# Altium footprint library 6-Connectors-3.PcbLib: 153 footprints (part 10 of 11)
Each footprint in its own frame and in the unit in brackets; x right, y up, seen from the top. Pads: shape width x height; smd on the part's side, far side on the other; paste and mask are expansions set on the pad; w line width, h text height; cw(c..) or ccw(c..) is an arc to the next point about the centre after c.
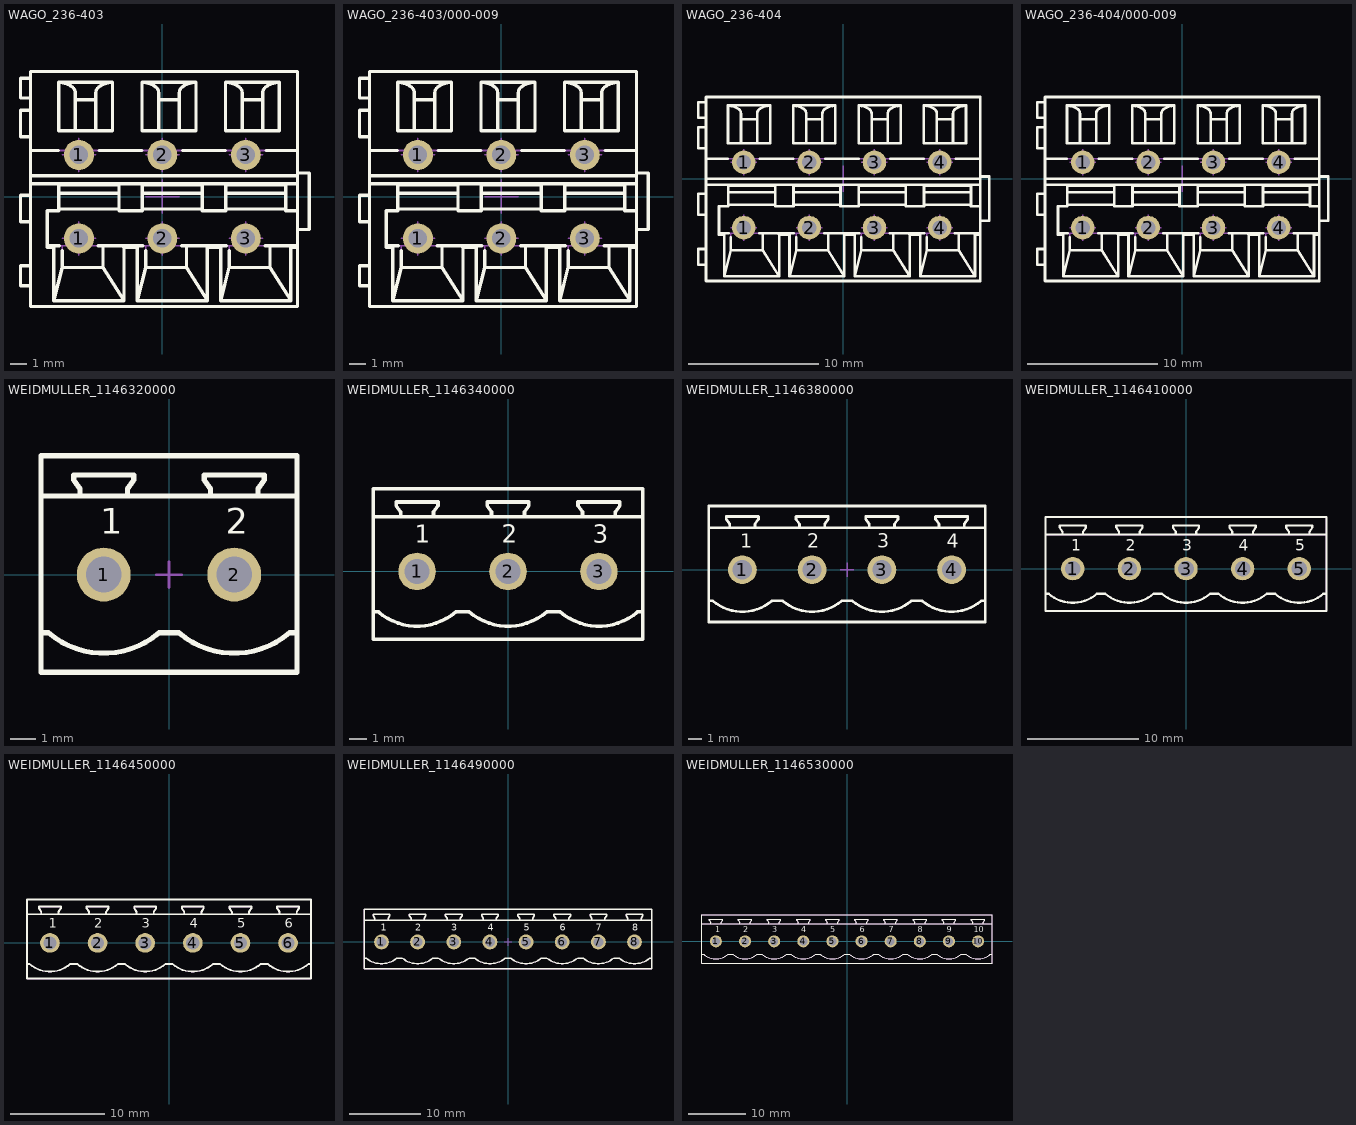
[diagram p9: the footprints below, top view; thin cyan lines are the x and y axes]

## WAGO_236-403 [mm] "16A 250VAC 3 Way PCB Terminal Block, Pitch 5mm, CAGE CLAMP?Connection, Wire Size Max: 2.5mm²"
height 13
pads (6):
  round 1.8 hole 1.1: 1(-5,-2.5) 1(-5,2.5) 2(0,-2.5) 2(0,2.5) 3(5,-2.5) 3(5,2.5)
Top Overlay:
  lines w0.2: -7.9,-5.34 -8.5,-5.34 -8.5,-4.14 -7.9,-4.14 ; -7.9,-1.51 -8.5,-1.51 -8.5,0.09 -7.9,0.09 ; -7.9,0.77 8.1,0.77 ; -7.9,1.256 8.1,1.256 -1.9,1.256 -1.4,1.256 ; -7.9,2.76 -6.223,2.76 ; -7.9,3.582 -8.5,3.582 -8.5,5.182 -7.9,5.182 ; -7.9,5.905 -8.5,5.905 -8.5,7.101 -7.9,7.101 ; -6.9,-2.937 -6.463,-2.937 ; -6.2,-0.745 -2.6,-0.745 ; -6.2,0.21 -2.6,0.21 ; -6.171,-2.937 -6.463,-2.937 ; -6,-3.25 -6,-4.245 ; -5.215,3.957 -5.215,6.149 ccw(c-5.715,6.192) -5.508,6.649 ccw(c-6.452,4.735) -6.215,6.857 ; -5.215,5.796 -3.985,5.796 ; -3.985,3.957 -3.985,6.149 cw(c-3.485,6.192) -3.692,6.649 cw(c-2.748,4.735) -2.985,6.857 ; -3.829,-2.937 -1.171,-2.937 ; -3.777,2.76 -1.223,2.76 ; -3.55,-2.937 -3.55,-4.245 ; -2.394,-2.937 -2.3,-3.043 ; -1.463,-2.937 -1.5,-3.043 ; -1.2,-0.745 2.4,-0.745 ; -1.2,0.21 2.4,0.21 ; -1,-3.25 -1,-4.245 ; -0.215,3.957 -0.215,6.149 ccw(c-0.715,6.192) -0.508,6.649 ccw(c-1.452,4.735) -1.215,6.857 ; -0.215,5.796 1.015,5.796 ; 1.015,3.957 1.015,6.149 cw(c1.515,6.192) 1.308,6.649 cw(c2.252,4.735) 2.015,6.857 ; 1.171,-2.937 3.829,-2.937 ; 1.223,2.76 3.777,2.76 ; 1.45,-2.937 1.45,-4.245 ; 2.606,-2.937 2.7,-3.043 ; 3.538,-2.937 3.5,-3.043 ; 3.8,-0.745 7.4,-0.745 ; 3.8,0.21 7.4,0.21 ; 4,-3.25 4,-4.245 ; 4.785,3.957 4.785,6.149 ccw(c4.285,6.192) 4.492,6.649 ccw(c3.548,4.735) 3.785,6.857 ; 4.785,5.796 6.015,5.796 ; 6.015,3.957 6.015,6.149 cw(c6.515,6.192) 6.308,6.649 cw(c7.252,4.735) 7.015,6.857 ; 6.171,-2.937 8.1,-2.937 ; 6.223,2.76 8.1,2.76 ; 6.45,-2.937 6.45,-4.245 ; 7.606,-2.937 7.7,-3.043 ; 8.1,-6.585 -7.9,-6.585 -7.9,7.5 8.1,7.5 8.1,-6.572 ; 8.1,-3.043 7.7,-3.043 ; 8.1,-1.968 8.8,-1.968 8.8,1.412 8.1,1.412 ; 8.1,-0.851 7.4,-0.851 7.4,0.705 3.8,0.705 3.8,-0.851 2.4,-0.851 2.4,0.705 -1.2,0.705 -1.2,-0.851 -2.6,-0.851 -2.6,0.705 -6.2,0.705 -6.2,-0.851 -6.9,-0.851 -6.9,-3.043 -6.5,-3.043 ; -6.5,-6.231 -6,-4.245 ; -6.5,-6.231 -2.3,-6.231 ; -6.5,-6.231 -6.5,-3.043 ; -6.5,-3.043 -6.463,-2.937 ; -6.215,6.857 -6.215,3.957 -2.985,3.957 -2.985,6.857 ; -6.215,6.857 -2.985,6.857 ; -6,-4.245 -3.55,-4.245 ; -3.55,-4.245 -2.3,-6.231 ; -2.3,-6.231 -2.3,-3.043 ; -2.3,-3.043 -1.5,-3.043 ; -1.5,-6.231 -1,-4.245 ; -1.5,-6.231 2.7,-6.231 ; -1.5,-6.231 -1.5,-3.043 ; -1.215,6.857 -1.215,3.957 2.015,3.957 2.015,6.857 ; -1.215,6.857 2.015,6.857 ; -1,-4.245 1.45,-4.245 ; 1.45,-4.245 2.7,-6.231 ; 2.7,-6.231 2.7,-3.043 ; 2.7,-3.043 3.5,-3.043 ; 3.5,-6.231 4,-4.245 ; 3.5,-6.231 7.7,-6.231 ; 3.5,-6.231 3.5,-3.043 ; 3.785,6.857 3.785,3.957 7.015,3.957 7.015,6.857 ; 3.785,6.857 7.015,6.857 ; 4,-4.245 6.45,-4.245 ; 6.45,-4.245 7.7,-6.231 ; 7.7,-6.231 7.7,-3.043
Mechanical 8:
  lines w0.1: -6,-2.5 -5,-2.5 ; -6,2.5 -5,2.5 ; -5,-3.5 -5,-2.5 ; -5,-1.5 -5,-2.5 ; -5,1.5 -5,2.5 ; -5,3.5 -5,2.5 ; -4,-2.5 -5,-2.5 ; -4,2.5 -5,2.5 ; -1,-2.5 0,-2.5 ; -1,0 0,0 ; -1,2.5 0,2.5 ; 0,-3.5 0,-2.5 ; 0,-1.5 0,-2.5 ; 0,-1 0,0 ; 0,1 0,0 ; 0,1.5 0,2.5 ; 0,3.5 0,2.5 ; 1,-2.5 0,-2.5 ; 1,0 0,0 ; 1,2.5 0,2.5 ; 4,-2.5 5,-2.5 ; 4,2.5 5,2.5 ; 5,-3.5 5,-2.5 ; 5,-1.5 5,-2.5 ; 5,1.5 5,2.5 ; 5,3.5 5,2.5 ; 6,-2.5 5,-2.5 ; 6,2.5 5,2.5
Mechanical 14:
  lines w0.1: -7.9,-5.34 -8.5,-5.34 -8.5,-4.14 -7.9,-4.14 ; -7.9,-1.51 -8.5,-1.51 -8.5,0.09 -7.9,0.09 ; -7.9,0.77 8.1,0.77 ; -7.9,1.256 8.1,1.256 -1.9,1.256 ; -7.9,2.76 8.1,2.76 ; -7.9,3.582 -8.5,3.582 -8.5,5.182 -7.9,5.182 ; -7.9,5.905 -8.5,5.905 -8.5,7.101 -7.9,7.101 ; -6.9,-2.937 8.1,-2.937 ; -6.463,-2.937 -6.5,-3.043 ; -6.2,-0.745 -2.6,-0.745 ; -6.2,0.21 -2.6,0.21 ; -6,-2.937 -6,-4.245 ; -5.215,3.957 -5.215,6.149 ccw(c-5.715,6.192) -5.508,6.649 ccw(c-6.452,4.735) -6.215,6.857 ; -5.215,5.796 -3.985,5.796 ; -3.985,3.957 -3.985,6.149 cw(c-3.485,6.192) -3.692,6.649 cw(c-2.748,4.735) -2.985,6.857 ; -3.55,-2.937 -3.55,-4.245 ; -2.394,-2.937 -2.3,-3.043 ; -1.463,-2.937 -1.5,-3.043 ; -1.2,-0.745 2.4,-0.745 ; -1.2,0.21 2.4,0.21 ; -1,-2.937 -1,-4.245 ; -0.215,3.957 -0.215,6.149 ccw(c-0.715,6.192) -0.508,6.649 ccw(c-1.452,4.735) -1.215,6.857 ; -0.215,5.796 1.015,5.796 ; 1.015,3.957 1.015,6.149 cw(c1.515,6.192) 1.308,6.649 cw(c2.252,4.735) 2.015,6.857 ; 1.45,-2.937 1.45,-4.245 ; 2.606,-2.937 2.7,-3.043 ; 3.538,-2.937 3.5,-3.043 ; 3.8,-0.745 7.4,-0.745 ; 3.8,0.21 7.4,0.21 ; 4,-2.937 4,-4.245 ; 4.785,3.957 4.785,6.149 ccw(c4.285,6.192) 4.492,6.649 ccw(c3.548,4.735) 3.785,6.857 ; 4.785,5.796 6.015,5.796 ; 6.015,3.957 6.015,6.149 cw(c6.515,6.192) 6.308,6.649 cw(c7.252,4.735) 7.015,6.857 ; 6.45,-2.937 6.45,-4.245 ; 7.606,-2.937 7.7,-3.043 ; 8.1,-6.585 -7.9,-6.585 -7.9,7.5 8.1,7.5 8.1,-6.572 ; 8.1,-3.043 7.7,-3.043 ; 8.1,-1.968 8.8,-1.968 8.8,1.412 8.1,1.412 ; 8.1,-0.851 7.4,-0.851 7.4,0.705 3.8,0.705 3.8,-0.851 2.4,-0.851 2.4,0.705 -1.2,0.705 -1.2,-0.851 -2.6,-0.851 -2.6,0.705 -6.2,0.705 -6.2,-0.851 -6.9,-0.851 -6.9,-3.043 -6.5,-3.043 ; -6.5,-6.231 -6,-4.245 ; -6.5,-6.231 -2.3,-6.231 ; -6.5,-6.231 -6.5,-3.043 ; -6.215,6.857 -6.215,3.957 -2.985,3.957 -2.985,6.857 ; -6.215,6.857 -2.985,6.857 ; -6,-4.245 -3.55,-4.245 ; -3.55,-4.245 -2.3,-6.231 ; -2.3,-6.231 -2.3,-3.043 ; -2.3,-3.043 -1.5,-3.043 ; -1.5,-6.231 -1,-4.245 ; -1.5,-6.231 2.7,-6.231 ; -1.5,-6.231 -1.5,-3.043 ; -1.215,6.857 -1.215,3.957 2.015,3.957 2.015,6.857 ; -1.215,6.857 2.015,6.857 ; -1,-4.245 1.45,-4.245 ; 1.45,-4.245 2.7,-6.231 ; 2.7,-6.231 2.7,-3.043 ; 2.7,-3.043 3.5,-3.043 ; 3.5,-6.231 4,-4.245 ; 3.5,-6.231 7.7,-6.231 ; 3.5,-6.231 3.5,-3.043 ; 3.785,6.857 3.785,3.957 7.015,3.957 7.015,6.857 ; 3.785,6.857 7.015,6.857 ; 4,-4.245 6.45,-4.245 ; 6.45,-4.245 7.7,-6.231 ; 7.7,-6.231 7.7,-3.043
3D body "WAGO_236-403.stp": height 12.71, standoff -4, extent -8.5,-6.585 8.8,7.5

## WAGO_236-403/000-009 [mm] "16A 250VAC 3 Way PCB Terminal Block, Pitch 5mm, CAGE CLAMP?Connection, Wire Size Max: 2.5mm²"
height 13
pads (6):
  round 1.8 hole 1.1: 1(-5,-2.5) 1(-5,2.5) 2(0,-2.5) 2(0,2.5) 3(5,-2.5) 3(5,2.5)
Top Overlay:
  lines w0.2: -7.9,-5.34 -8.5,-5.34 -8.5,-4.14 -7.9,-4.14 ; -7.9,-1.51 -8.5,-1.51 -8.5,0.09 -7.9,0.09 ; -7.9,0.77 8.1,0.77 ; -7.9,1.256 8.1,1.256 -1.9,1.256 -1.4,1.256 ; -7.9,2.76 -6.223,2.76 ; -7.9,3.582 -8.5,3.582 -8.5,5.182 -7.9,5.182 ; -7.9,5.905 -8.5,5.905 -8.5,7.101 -7.9,7.101 ; -6.9,-2.937 -6.463,-2.937 ; -6.2,-0.745 -2.6,-0.745 ; -6.2,0.21 -2.6,0.21 ; -6.171,-2.937 -6.463,-2.937 ; -6,-3.25 -6,-4.245 ; -5.215,3.957 -5.215,6.149 ccw(c-5.715,6.192) -5.508,6.649 ccw(c-6.452,4.735) -6.215,6.857 ; -5.215,5.796 -3.985,5.796 ; -3.985,3.957 -3.985,6.149 cw(c-3.485,6.192) -3.692,6.649 cw(c-2.748,4.735) -2.985,6.857 ; -3.829,-2.937 -1.171,-2.937 ; -3.777,2.76 -1.223,2.76 ; -3.55,-2.937 -3.55,-4.245 ; -2.394,-2.937 -2.3,-3.043 ; -1.463,-2.937 -1.5,-3.043 ; -1.2,-0.745 2.4,-0.745 ; -1.2,0.21 2.4,0.21 ; -1,-3.25 -1,-4.245 ; -0.215,3.957 -0.215,6.149 ccw(c-0.715,6.192) -0.508,6.649 ccw(c-1.452,4.735) -1.215,6.857 ; -0.215,5.796 1.015,5.796 ; 1.015,3.957 1.015,6.149 cw(c1.515,6.192) 1.308,6.649 cw(c2.252,4.735) 2.015,6.857 ; 1.171,-2.937 3.829,-2.937 ; 1.223,2.76 3.777,2.76 ; 1.45,-2.937 1.45,-4.245 ; 2.606,-2.937 2.7,-3.043 ; 3.538,-2.937 3.5,-3.043 ; 3.8,-0.745 7.4,-0.745 ; 3.8,0.21 7.4,0.21 ; 4,-3.25 4,-4.245 ; 4.785,3.957 4.785,6.149 ccw(c4.285,6.192) 4.492,6.649 ccw(c3.548,4.735) 3.785,6.857 ; 4.785,5.796 6.015,5.796 ; 6.015,3.957 6.015,6.149 cw(c6.515,6.192) 6.308,6.649 cw(c7.252,4.735) 7.015,6.857 ; 6.171,-2.937 8.1,-2.937 ; 6.223,2.76 8.1,2.76 ; 6.45,-2.937 6.45,-4.245 ; 7.606,-2.937 7.7,-3.043 ; 8.1,-6.585 -7.9,-6.585 -7.9,7.5 8.1,7.5 8.1,-6.572 ; 8.1,-3.043 7.7,-3.043 ; 8.1,-1.968 8.8,-1.968 8.8,1.412 8.1,1.412 ; 8.1,-0.851 7.4,-0.851 7.4,0.705 3.8,0.705 3.8,-0.851 2.4,-0.851 2.4,0.705 -1.2,0.705 -1.2,-0.851 -2.6,-0.851 -2.6,0.705 -6.2,0.705 -6.2,-0.851 -6.9,-0.851 -6.9,-3.043 -6.5,-3.043 ; -6.5,-6.231 -6,-4.245 ; -6.5,-6.231 -2.3,-6.231 ; -6.5,-6.231 -6.5,-3.043 ; -6.5,-3.043 -6.463,-2.937 ; -6.215,6.857 -6.215,3.957 -2.985,3.957 -2.985,6.857 ; -6.215,6.857 -2.985,6.857 ; -6,-4.245 -3.55,-4.245 ; -3.55,-4.245 -2.3,-6.231 ; -2.3,-6.231 -2.3,-3.043 ; -2.3,-3.043 -1.5,-3.043 ; -1.5,-6.231 -1,-4.245 ; -1.5,-6.231 2.7,-6.231 ; -1.5,-6.231 -1.5,-3.043 ; -1.215,6.857 -1.215,3.957 2.015,3.957 2.015,6.857 ; -1.215,6.857 2.015,6.857 ; -1,-4.245 1.45,-4.245 ; 1.45,-4.245 2.7,-6.231 ; 2.7,-6.231 2.7,-3.043 ; 2.7,-3.043 3.5,-3.043 ; 3.5,-6.231 4,-4.245 ; 3.5,-6.231 7.7,-6.231 ; 3.5,-6.231 3.5,-3.043 ; 3.785,6.857 3.785,3.957 7.015,3.957 7.015,6.857 ; 3.785,6.857 7.015,6.857 ; 4,-4.245 6.45,-4.245 ; 6.45,-4.245 7.7,-6.231 ; 7.7,-6.231 7.7,-3.043
Mechanical 8:
  lines w0.1: -6,-2.5 -5,-2.5 ; -6,2.5 -5,2.5 ; -5,-3.5 -5,-2.5 ; -5,-1.5 -5,-2.5 ; -5,1.5 -5,2.5 ; -5,3.5 -5,2.5 ; -4,-2.5 -5,-2.5 ; -4,2.5 -5,2.5 ; -1,-2.5 0,-2.5 ; -1,0 0,0 ; -1,2.5 0,2.5 ; 0,-3.5 0,-2.5 ; 0,-1.5 0,-2.5 ; 0,-1 0,0 ; 0,1 0,0 ; 0,1.5 0,2.5 ; 0,3.5 0,2.5 ; 1,-2.5 0,-2.5 ; 1,0 0,0 ; 1,2.5 0,2.5 ; 4,-2.5 5,-2.5 ; 4,2.5 5,2.5 ; 5,-3.5 5,-2.5 ; 5,-1.5 5,-2.5 ; 5,1.5 5,2.5 ; 5,3.5 5,2.5 ; 6,-2.5 5,-2.5 ; 6,2.5 5,2.5
Mechanical 14:
  lines w0.1: -7.9,-5.34 -8.5,-5.34 -8.5,-4.14 -7.9,-4.14 ; -7.9,-1.51 -8.5,-1.51 -8.5,0.09 -7.9,0.09 ; -7.9,0.77 8.1,0.77 ; -7.9,1.256 8.1,1.256 -1.9,1.256 ; -7.9,2.76 8.1,2.76 ; -7.9,3.582 -8.5,3.582 -8.5,5.182 -7.9,5.182 ; -7.9,5.905 -8.5,5.905 -8.5,7.101 -7.9,7.101 ; -6.9,-2.937 8.1,-2.937 ; -6.463,-2.937 -6.5,-3.043 ; -6.2,-0.745 -2.6,-0.745 ; -6.2,0.21 -2.6,0.21 ; -6,-2.937 -6,-4.245 ; -5.215,3.957 -5.215,6.149 ccw(c-5.715,6.192) -5.508,6.649 ccw(c-6.452,4.735) -6.215,6.857 ; -5.215,5.796 -3.985,5.796 ; -3.985,3.957 -3.985,6.149 cw(c-3.485,6.192) -3.692,6.649 cw(c-2.748,4.735) -2.985,6.857 ; -3.55,-2.937 -3.55,-4.245 ; -2.394,-2.937 -2.3,-3.043 ; -1.463,-2.937 -1.5,-3.043 ; -1.2,-0.745 2.4,-0.745 ; -1.2,0.21 2.4,0.21 ; -1,-2.937 -1,-4.245 ; -0.215,3.957 -0.215,6.149 ccw(c-0.715,6.192) -0.508,6.649 ccw(c-1.452,4.735) -1.215,6.857 ; -0.215,5.796 1.015,5.796 ; 1.015,3.957 1.015,6.149 cw(c1.515,6.192) 1.308,6.649 cw(c2.252,4.735) 2.015,6.857 ; 1.45,-2.937 1.45,-4.245 ; 2.606,-2.937 2.7,-3.043 ; 3.538,-2.937 3.5,-3.043 ; 3.8,-0.745 7.4,-0.745 ; 3.8,0.21 7.4,0.21 ; 4,-2.937 4,-4.245 ; 4.785,3.957 4.785,6.149 ccw(c4.285,6.192) 4.492,6.649 ccw(c3.548,4.735) 3.785,6.857 ; 4.785,5.796 6.015,5.796 ; 6.015,3.957 6.015,6.149 cw(c6.515,6.192) 6.308,6.649 cw(c7.252,4.735) 7.015,6.857 ; 6.45,-2.937 6.45,-4.245 ; 7.606,-2.937 7.7,-3.043 ; 8.1,-6.585 -7.9,-6.585 -7.9,7.5 8.1,7.5 8.1,-6.572 ; 8.1,-3.043 7.7,-3.043 ; 8.1,-1.968 8.8,-1.968 8.8,1.412 8.1,1.412 ; 8.1,-0.851 7.4,-0.851 7.4,0.705 3.8,0.705 3.8,-0.851 2.4,-0.851 2.4,0.705 -1.2,0.705 -1.2,-0.851 -2.6,-0.851 -2.6,0.705 -6.2,0.705 -6.2,-0.851 -6.9,-0.851 -6.9,-3.043 -6.5,-3.043 ; -6.5,-6.231 -6,-4.245 ; -6.5,-6.231 -2.3,-6.231 ; -6.5,-6.231 -6.5,-3.043 ; -6.215,6.857 -6.215,3.957 -2.985,3.957 -2.985,6.857 ; -6.215,6.857 -2.985,6.857 ; -6,-4.245 -3.55,-4.245 ; -3.55,-4.245 -2.3,-6.231 ; -2.3,-6.231 -2.3,-3.043 ; -2.3,-3.043 -1.5,-3.043 ; -1.5,-6.231 -1,-4.245 ; -1.5,-6.231 2.7,-6.231 ; -1.5,-6.231 -1.5,-3.043 ; -1.215,6.857 -1.215,3.957 2.015,3.957 2.015,6.857 ; -1.215,6.857 2.015,6.857 ; -1,-4.245 1.45,-4.245 ; 1.45,-4.245 2.7,-6.231 ; 2.7,-6.231 2.7,-3.043 ; 2.7,-3.043 3.5,-3.043 ; 3.5,-6.231 4,-4.245 ; 3.5,-6.231 7.7,-6.231 ; 3.5,-6.231 3.5,-3.043 ; 3.785,6.857 3.785,3.957 7.015,3.957 7.015,6.857 ; 3.785,6.857 7.015,6.857 ; 4,-4.245 6.45,-4.245 ; 6.45,-4.245 7.7,-6.231 ; 7.7,-6.231 7.7,-3.043
3D body "WAGO_236-403-009.stp": height 12.71, standoff -4, extent -8.5,-6.585 8.8,7.5

## WAGO_236-404 [mm] "16A 250VAC 4 Way PCB Terminal Block, Pitch 5mm, CAGE CLAMP?Connection, Wire Size Max: 2.5mm²"
height 13
pads (8):
  round 1.8 hole 1.1: 1(-7.6,-3.756) 1(-7.6,1.244) 2(-2.6,-3.756) 2(-2.6,1.244) 3(2.4,-3.756) 3(2.4,1.244) 4(7.4,-3.756) 4(7.4,1.244)
Top Overlay:
  lines w0.2: -10.5,-6.596 -11.1,-6.596 -11.1,-5.396 -10.5,-5.396 ; -10.5,-2.766 -11.1,-2.766 -11.1,-1.166 -10.5,-1.166 ; -10.5,-0.486 10.5,-0.486 ; -10.5,1.504 -8.823,1.504 ; -10.5,2.325 -11.1,2.325 -11.1,3.925 -10.5,3.925 ; -10.5,4.649 -11.1,4.649 -11.1,5.844 -10.5,5.844 ; -9.5,-4.193 -9.063,-4.193 ; -8.8,-2.001 -5.2,-2.001 ; -8.8,-1.047 -5.2,-1.047 ; -8.771,-4.193 -9.063,-4.193 ; -8.6,-4.506 -8.6,-5.501 ; -7.815,2.701 -7.815,4.893 ccw(c-8.315,4.936) -8.108,5.393 ccw(c-9.052,3.479) -8.815,5.6 ; -7.815,4.54 -6.585,4.54 ; -6.585,2.701 -6.585,4.893 cw(c-6.085,4.936) -6.292,5.393 cw(c-5.348,3.479) -5.585,5.6 ; -6.429,-4.193 -3.771,-4.193 ; -6.377,1.504 -3.823,1.504 ; -6.15,-4.193 -6.15,-5.501 ; -3.8,-2.001 -0.2,-2.001 ; -3.8,-1.047 -0.2,-1.047 ; -3.6,-4.506 -3.6,-5.501 ; -2.815,2.701 -2.815,4.893 ccw(c-3.315,4.936) -3.108,5.393 ccw(c-4.052,3.479) -3.815,5.6 ; -2.815,4.54 -1.585,4.54 ; -1.585,2.701 -1.585,4.893 cw(c-1.085,4.936) -1.292,5.393 cw(c-0.348,3.479) -0.585,5.6 ; -1.429,-4.193 1.229,-4.193 ; -1.377,1.504 1.177,1.504 ; -1.15,-4.193 -1.15,-5.501 ; -1,0 1,0 ; 0.006,-4.193 0.1,-4.299 ; 0.938,-4.193 0.9,-4.299 ; 1.2,-2.001 4.8,-2.001 ; 1.2,-1.047 4.8,-1.047 ; 1.4,-4.506 1.4,-5.501 ; 2.185,2.701 2.185,4.893 ccw(c1.685,4.936) 1.892,5.393 ccw(c0.948,3.479) 1.185,5.6 ; 2.185,4.54 3.415,4.54 ; 3.415,2.701 3.415,4.893 cw(c3.915,4.936) 3.708,5.393 cw(c4.652,3.479) 4.415,5.6 ; 3.571,-4.193 6.229,-4.193 ; 3.623,1.504 6.177,1.504 ; 3.85,-4.193 3.85,-5.501 ; 5.006,-4.193 5.1,-4.299 ; 5.938,-4.193 5.9,-4.299 ; 6.2,-2.001 9.8,-2.001 ; 6.2,-1.047 9.8,-1.047 ; 6.4,-4.506 6.4,-5.501 ; 7.185,2.701 7.185,4.893 ccw(c6.685,4.936) 6.892,5.393 ccw(c5.948,3.479) 6.185,5.6 ; 7.185,4.54 8.415,4.54 ; 8.415,2.701 8.415,4.893 cw(c8.915,4.936) 8.708,5.393 cw(c9.652,3.479) 9.415,5.6 ; 8.571,-4.193 10.5,-4.193 ; 8.623,1.504 10.5,1.504 ; 8.85,-4.193 8.85,-5.501 ; 10.006,-4.193 10.1,-4.299 ; 10.5,-7.842 -10.5,-7.842 -10.5,6.244 10.5,6.244 10.5,-7.828 ; 10.5,-4.299 10.1,-4.299 ; 10.5,-3.224 11.2,-3.224 11.2,0.156 10.5,0.156 ; 10.5,-2.107 9.8,-2.107 9.8,-0.552 6.2,-0.552 6.2,-2.107 4.8,-2.107 4.8,-0.552 1.2,-0.552 1.2,-2.107 -0.2,-2.107 -0.2,-0.552 -3.8,-0.552 -3.8,-2.107 -5.2,-2.107 -5.2,-0.552 -8.8,-0.552 -8.8,-2.107 -9.5,-2.107 -9.5,-4.299 -9.1,-4.299 ; -9.1,-7.487 -8.6,-5.501 ; -9.1,-7.487 -4.9,-7.487 ; -9.1,-7.487 -9.1,-4.299 ; -9.1,-4.299 -9.063,-4.193 ; -8.815,5.6 -8.815,2.701 -5.585,2.701 -5.585,5.6 ; -8.815,5.6 -5.585,5.6 ; -8.6,-5.501 -6.15,-5.501 ; -6.15,-5.501 -4.9,-7.487 ; -4.9,-7.487 -4.9,-4.299 ; -4.9,-4.299 -4.1,-4.299 ; -4.9,-4.299 -4.994,-4.193 -4.063,-4.193 -4.1,-4.299 ; -4.1,-7.487 -3.6,-5.501 ; -4.1,-7.487 0.1,-7.487 ; -4.1,-7.487 -4.1,-4.299 ; -3.815,5.6 -3.815,2.701 -0.585,2.701 -0.585,5.6 ; -3.815,5.6 -0.585,5.6 ; -3.6,-5.501 -1.15,-5.501 ; -1.15,-5.501 0.1,-7.487 ; 0.1,-7.487 0.1,-4.299 ; 0.1,-4.299 0.9,-4.299 ; 0.9,-7.487 1.4,-5.501 ; 0.9,-7.487 5.1,-7.487 ; 0.9,-7.487 0.9,-4.299 ; 1.185,5.6 1.185,2.701 4.415,2.701 4.415,5.6 ; 1.185,5.6 4.415,5.6 ; 1.4,-5.501 3.85,-5.501 ; 3.85,-5.501 5.1,-7.487 ; 5.1,-7.487 5.1,-4.299 ; 5.1,-4.299 5.9,-4.299 ; 5.9,-7.487 6.4,-5.501 ; 5.9,-7.487 10.1,-7.487 ; 5.9,-7.487 5.9,-4.299 ; 6.185,5.6 6.185,2.701 9.415,2.701 9.415,5.6 ; 6.185,5.6 9.415,5.6 ; 6.4,-5.501 8.85,-5.501 ; 8.85,-5.501 10.1,-7.487 ; 10.1,-7.487 10.1,-4.299 ; -10.5,0 10.5,0 -10.5,0
Mechanical 8:
  lines w0.1: -8.6,-3.756 -7.6,-3.756 ; -8.6,1.244 -7.6,1.244 ; -7.6,-4.756 -7.6,-3.756 ; -7.6,-2.756 -7.6,-3.756 ; -7.6,0.244 -7.6,1.244 ; -7.6,2.244 -7.6,1.244 ; -6.6,-3.756 -7.6,-3.756 ; -6.6,1.244 -7.6,1.244 ; -3.6,-3.756 -2.6,-3.756 ; -3.6,1.244 -2.6,1.244 ; -2.6,-4.756 -2.6,-3.756 ; -2.6,-2.756 -2.6,-3.756 ; -2.6,0.244 -2.6,1.244 ; -2.6,2.244 -2.6,1.244 ; -1.6,-3.756 -2.6,-3.756 ; -1.6,1.244 -2.6,1.244 ; -1,0 1,0 ; 0,-1 0,1 ; 1.4,-3.756 2.4,-3.756 ; 1.4,1.244 2.4,1.244 ; 2.4,-4.756 2.4,-3.756 ; 2.4,-2.756 2.4,-3.756 ; 2.4,0.244 2.4,1.244 ; 2.4,2.244 2.4,1.244 ; 3.4,-3.756 2.4,-3.756 ; 3.4,1.244 2.4,1.244 ; 6.4,-3.756 7.4,-3.756 ; 6.4,1.244 7.4,1.244 ; 7.4,-4.756 7.4,-3.756 ; 7.4,-2.756 7.4,-3.756 ; 7.4,0.244 7.4,1.244 ; 7.4,2.244 7.4,1.244 ; 8.4,-3.756 7.4,-3.756 ; 8.4,1.244 7.4,1.244
Mechanical 14:
  lines w0.1: -10.5,-6.596 -11.1,-6.596 -11.1,-5.396 -10.5,-5.396 ; -10.5,-2.766 -11.1,-2.766 -11.1,-1.166 -10.5,-1.166 ; -10.5,-0.486 10.5,-0.486 ; -10.5,1.504 10.5,1.504 ; -10.5,2.325 -11.1,2.325 -11.1,3.925 -10.5,3.925 ; -10.5,4.649 -11.1,4.649 -11.1,5.844 -10.5,5.844 ; -9.5,-4.193 -9.063,-4.193 ; -8.8,-2.001 -5.2,-2.001 ; -8.8,-1.047 -5.2,-1.047 ; -8.6,-4.193 -8.6,-5.501 ; -7.815,2.701 -7.815,4.893 ccw(c-8.315,4.936) -8.108,5.393 ccw(c-9.052,3.479) -8.815,5.6 ; -7.815,4.54 -6.585,4.54 ; -6.585,2.701 -6.585,4.893 cw(c-6.085,4.936) -6.292,5.393 cw(c-5.348,3.479) -5.585,5.6 ; -6.15,-4.193 -6.15,-5.501 ; -3.8,-2.001 -0.2,-2.001 ; -3.8,-1.047 -0.2,-1.047 ; -3.6,-4.193 -3.6,-5.501 ; -2.815,2.701 -2.815,4.893 ccw(c-3.315,4.936) -3.108,5.393 ccw(c-4.052,3.479) -3.815,5.6 ; -2.815,4.54 -1.585,4.54 ; -1.585,2.701 -1.585,4.893 cw(c-1.085,4.936) -1.292,5.393 cw(c-0.348,3.479) -0.585,5.6 ; -1.15,-4.193 -1.15,-5.501 ; 0.006,-4.193 0.1,-4.299 ; 0.938,-4.193 0.9,-4.299 ; 1.2,-2.001 4.8,-2.001 ; 1.2,-1.047 4.8,-1.047 ; 1.4,-4.193 1.4,-5.501 ; 2.185,2.701 2.185,4.893 ccw(c1.685,4.936) 1.892,5.393 ccw(c0.948,3.479) 1.185,5.6 ; 2.185,4.54 3.415,4.54 ; 3.415,2.701 3.415,4.893 cw(c3.915,4.936) 3.708,5.393 cw(c4.652,3.479) 4.415,5.6 ; 3.85,-4.193 3.85,-5.501 ; 5.006,-4.193 5.1,-4.299 ; 5.938,-4.193 5.9,-4.299 ; 6.2,-2.001 9.8,-2.001 ; 6.2,-1.047 9.8,-1.047 ; 6.4,-4.193 6.4,-5.501 ; 7.185,2.701 7.185,4.893 ccw(c6.685,4.936) 6.892,5.393 ccw(c5.948,3.479) 6.185,5.6 ; 7.185,4.54 8.415,4.54 ; 8.415,2.701 8.415,4.893 cw(c8.915,4.936) 8.708,5.393 cw(c9.652,3.479) 9.415,5.6 ; 8.85,-4.193 8.85,-5.501 ; 10.006,-4.193 10.1,-4.299 ; 10.5,-7.842 -10.5,-7.842 -10.5,6.244 10.5,6.244 10.5,-7.828 ; 10.5,-4.299 10.1,-4.299 ; 10.5,-4.193 -9.063,-4.193 ; 10.5,-3.224 11.2,-3.224 11.2,0.156 10.5,0.156 ; 10.5,-2.107 9.8,-2.107 9.8,-0.552 6.2,-0.552 6.2,-2.107 4.8,-2.107 4.8,-0.552 1.2,-0.552 1.2,-2.107 -0.2,-2.107 -0.2,-0.552 -3.8,-0.552 -3.8,-2.107 -5.2,-2.107 -5.2,-0.552 -8.8,-0.552 -8.8,-2.107 -9.5,-2.107 -9.5,-4.299 -9.1,-4.299 ; -9.1,-7.487 -8.6,-5.501 ; -9.1,-7.487 -4.9,-7.487 ; -9.1,-7.487 -9.1,-4.299 ; -9.1,-4.299 -9.063,-4.193 ; -8.815,5.6 -8.815,2.701 -5.585,2.701 -5.585,5.6 ; -8.815,5.6 -5.585,5.6 ; -8.6,-5.501 -6.15,-5.501 ; -6.15,-5.501 -4.9,-7.487 ; -4.9,-7.487 -4.9,-4.299 ; -4.9,-4.299 -4.1,-4.299 ; -4.9,-4.299 -4.994,-4.193 -4.063,-4.193 -4.1,-4.299 ; -4.1,-7.487 -3.6,-5.501 ; -4.1,-7.487 0.1,-7.487 ; -4.1,-7.487 -4.1,-4.299 ; -3.815,5.6 -3.815,2.701 -0.585,2.701 -0.585,5.6 ; -3.815,5.6 -0.585,5.6 ; -3.6,-5.501 -1.15,-5.501 ; -1.15,-5.501 0.1,-7.487 ; 0.1,-7.487 0.1,-4.299 ; 0.1,-4.299 0.9,-4.299 ; 0.9,-7.487 1.4,-5.501 ; 0.9,-7.487 5.1,-7.487 ; 0.9,-7.487 0.9,-4.299 ; 1.185,5.6 1.185,2.701 4.415,2.701 4.415,5.6 ; 1.185,5.6 4.415,5.6 ; 1.4,-5.501 3.85,-5.501 ; 3.85,-5.501 5.1,-7.487 ; 5.1,-7.487 5.1,-4.299 ; 5.1,-4.299 5.9,-4.299 ; 5.9,-7.487 6.4,-5.501 ; 5.9,-7.487 10.1,-7.487 ; 5.9,-7.487 5.9,-4.299 ; 6.185,5.6 6.185,2.701 9.415,2.701 9.415,5.6 ; 6.185,5.6 9.415,5.6 ; 6.4,-5.501 8.85,-5.501 ; 8.85,-5.501 10.1,-7.487 ; 10.1,-7.487 10.1,-4.299 ; -10.5,0 10.5,0 -10.5,0
3D body "WAGO_236-404.stp": height 12.71, standoff -4, extent -11.1,-7.841 11.2,6.244

## WAGO_236-404/000-009 [mm] "16A 250VAC 4 Way PCB Terminal Block, Pitch 5mm, CAGE CLAMP?Connection, Wire Size Max: 2.5mm²"
height 13
pads (8):
  round 1.8 hole 1.1: 1(-7.6,-3.756) 1(-7.6,1.244) 2(-2.6,-3.756) 2(-2.6,1.244) 3(2.4,-3.756) 3(2.4,1.244) 4(7.4,-3.756) 4(7.4,1.244)
Top Overlay:
  lines w0.2: -10.5,-6.596 -11.1,-6.596 -11.1,-5.396 -10.5,-5.396 ; -10.5,-2.766 -11.1,-2.766 -11.1,-1.166 -10.5,-1.166 ; -10.5,-0.486 10.5,-0.486 ; -10.5,1.504 -8.823,1.504 ; -10.5,2.325 -11.1,2.325 -11.1,3.925 -10.5,3.925 ; -10.5,4.649 -11.1,4.649 -11.1,5.844 -10.5,5.844 ; -9.5,-4.193 -9.063,-4.193 ; -8.8,-2.001 -5.2,-2.001 ; -8.8,-1.047 -5.2,-1.047 ; -8.771,-4.193 -9.063,-4.193 ; -8.6,-4.506 -8.6,-5.501 ; -7.815,2.701 -7.815,4.893 ccw(c-8.315,4.936) -8.108,5.393 ccw(c-9.052,3.479) -8.815,5.6 ; -7.815,4.54 -6.585,4.54 ; -6.585,2.701 -6.585,4.893 cw(c-6.085,4.936) -6.292,5.393 cw(c-5.348,3.479) -5.585,5.6 ; -6.429,-4.193 -3.771,-4.193 ; -6.377,1.504 -3.823,1.504 ; -6.15,-4.193 -6.15,-5.501 ; -3.8,-2.001 -0.2,-2.001 ; -3.8,-1.047 -0.2,-1.047 ; -3.6,-4.506 -3.6,-5.501 ; -2.815,2.701 -2.815,4.893 ccw(c-3.315,4.936) -3.108,5.393 ccw(c-4.052,3.479) -3.815,5.6 ; -2.815,4.54 -1.585,4.54 ; -1.585,2.701 -1.585,4.893 cw(c-1.085,4.936) -1.292,5.393 cw(c-0.348,3.479) -0.585,5.6 ; -1.429,-4.193 1.229,-4.193 ; -1.377,1.504 1.177,1.504 ; -1.15,-4.193 -1.15,-5.501 ; -1,0 1,0 ; 0.006,-4.193 0.1,-4.299 ; 0.938,-4.193 0.9,-4.299 ; 1.2,-2.001 4.8,-2.001 ; 1.2,-1.047 4.8,-1.047 ; 1.4,-4.506 1.4,-5.501 ; 2.185,2.701 2.185,4.893 ccw(c1.685,4.936) 1.892,5.393 ccw(c0.948,3.479) 1.185,5.6 ; 2.185,4.54 3.415,4.54 ; 3.415,2.701 3.415,4.893 cw(c3.915,4.936) 3.708,5.393 cw(c4.652,3.479) 4.415,5.6 ; 3.571,-4.193 6.229,-4.193 ; 3.623,1.504 6.177,1.504 ; 3.85,-4.193 3.85,-5.501 ; 5.006,-4.193 5.1,-4.299 ; 5.938,-4.193 5.9,-4.299 ; 6.2,-2.001 9.8,-2.001 ; 6.2,-1.047 9.8,-1.047 ; 6.4,-4.506 6.4,-5.501 ; 7.185,2.701 7.185,4.893 ccw(c6.685,4.936) 6.892,5.393 ccw(c5.948,3.479) 6.185,5.6 ; 7.185,4.54 8.415,4.54 ; 8.415,2.701 8.415,4.893 cw(c8.915,4.936) 8.708,5.393 cw(c9.652,3.479) 9.415,5.6 ; 8.571,-4.193 10.5,-4.193 ; 8.623,1.504 10.5,1.504 ; 8.85,-4.193 8.85,-5.501 ; 10.006,-4.193 10.1,-4.299 ; 10.5,-7.842 -10.5,-7.842 -10.5,6.244 10.5,6.244 10.5,-7.828 ; 10.5,-4.299 10.1,-4.299 ; 10.5,-3.224 11.2,-3.224 11.2,0.156 10.5,0.156 ; 10.5,-2.107 9.8,-2.107 9.8,-0.552 6.2,-0.552 6.2,-2.107 4.8,-2.107 4.8,-0.552 1.2,-0.552 1.2,-2.107 -0.2,-2.107 -0.2,-0.552 -3.8,-0.552 -3.8,-2.107 -5.2,-2.107 -5.2,-0.552 -8.8,-0.552 -8.8,-2.107 -9.5,-2.107 -9.5,-4.299 -9.1,-4.299 ; -9.1,-7.487 -8.6,-5.501 ; -9.1,-7.487 -4.9,-7.487 ; -9.1,-7.487 -9.1,-4.299 ; -9.1,-4.299 -9.063,-4.193 ; -8.815,5.6 -8.815,2.701 -5.585,2.701 -5.585,5.6 ; -8.815,5.6 -5.585,5.6 ; -8.6,-5.501 -6.15,-5.501 ; -6.15,-5.501 -4.9,-7.487 ; -4.9,-7.487 -4.9,-4.299 ; -4.9,-4.299 -4.1,-4.299 ; -4.9,-4.299 -4.994,-4.193 -4.063,-4.193 -4.1,-4.299 ; -4.1,-7.487 -3.6,-5.501 ; -4.1,-7.487 0.1,-7.487 ; -4.1,-7.487 -4.1,-4.299 ; -3.815,5.6 -3.815,2.701 -0.585,2.701 -0.585,5.6 ; -3.815,5.6 -0.585,5.6 ; -3.6,-5.501 -1.15,-5.501 ; -1.15,-5.501 0.1,-7.487 ; 0.1,-7.487 0.1,-4.299 ; 0.1,-4.299 0.9,-4.299 ; 0.9,-7.487 1.4,-5.501 ; 0.9,-7.487 5.1,-7.487 ; 0.9,-7.487 0.9,-4.299 ; 1.185,5.6 1.185,2.701 4.415,2.701 4.415,5.6 ; 1.185,5.6 4.415,5.6 ; 1.4,-5.501 3.85,-5.501 ; 3.85,-5.501 5.1,-7.487 ; 5.1,-7.487 5.1,-4.299 ; 5.1,-4.299 5.9,-4.299 ; 5.9,-7.487 6.4,-5.501 ; 5.9,-7.487 10.1,-7.487 ; 5.9,-7.487 5.9,-4.299 ; 6.185,5.6 6.185,2.701 9.415,2.701 9.415,5.6 ; 6.185,5.6 9.415,5.6 ; 6.4,-5.501 8.85,-5.501 ; 8.85,-5.501 10.1,-7.487 ; 10.1,-7.487 10.1,-4.299 ; -10.5,0 10.5,0 -10.5,0